# Altium footprint library Power_Lib_Altium.PcbLib: 383 footprints (part 2 of 24)
Each footprint in its own frame and in the unit in brackets; x right, y up, seen from the top. Pads: shape width x height; smd on the part's side, far side on the other; paste and mask are expansions set on the pad; w line width, h text height; cw(c..) or ccw(c..) is an arc to the next point about the centre after c.
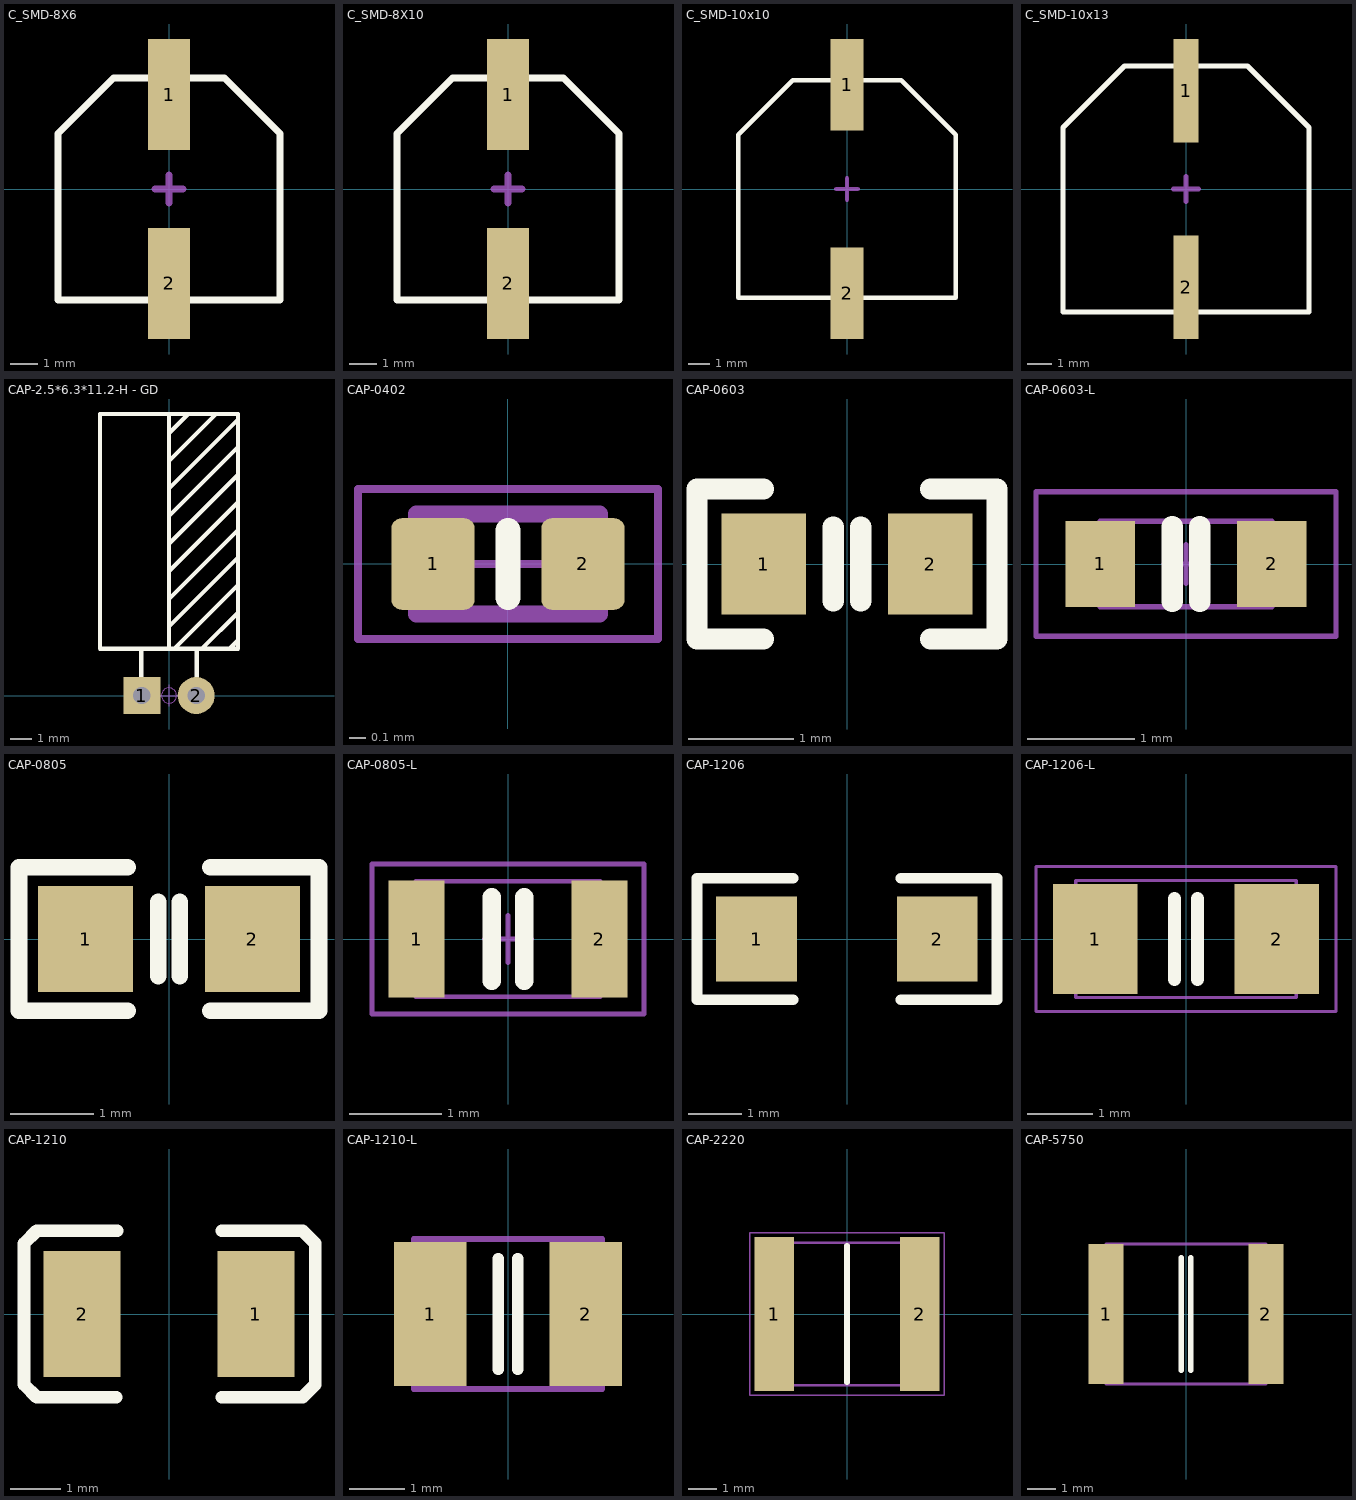
[diagram p1: the footprints below, top view; thin cyan lines are the x and y axes]

## C_SMD-8X6 [mm]
pads (2):
  rect 1.5x4 smd: 1(0,3.4) 2(0,-3.4)
Top Overlay:
  lines w0.254: -4,-4 -4,2 -2,4 2,4 4,2 4,-4 -4,-4
Mechanical 15:
  lines w0.254: -0.5,0 0.5,0 ; 0,-0.5 0,0.5
3D body "User Library-CL_series_size8x6,2.STEP": height 6.2, standoff 0, extent -4.15,-4.45 4.15,4.45

## C_SMD-8X10 [mm]
pads (2):
  rect 1.5x4 smd: 1(0,3.4) 2(0,-3.4)
Top Overlay:
  lines w0.254: -4,-4 -4,2 -2,4 2,4 4,2 4,-4 -4,-4
Mechanical 15:
  lines w0.254: -0.5,0 0.5,0 ; 0,-0.5 0,0.5
3D body "User Library-CL_series_size8x10.STEP": height 10, standoff 0, extent -4.15,-4.5 4.15,4.4

## C_SMD-10x10 [mm]
pads (2):
  rect 1.5x4.2 smd: 1(0,4.8) 2(0,-4.8)
Top Overlay:
  lines w0.2: -5,-5 5,-5 5,2.5 2.5,5 -2.5,5 -5,2.5 -5,-5
Mechanical 15:
  lines w0.2: -0.5,0 0.5,0 ; 0,-0.5 0,0.5
3D body "User Library-cap_10x10x10-1.STEP": height -0.4, standoff -10.9, extent -5.25,-5.899 5.25,5.901

## C_SMD-10x13 [mm]
pads (2):
  rect 1x4.2 smd: 1(0,4) 2(0,-4)
Top Overlay:
  lines w0.2: -5,-5 5,-5 5,2.5 2.5,5 -2.5,5 -5,2.5 -5,-5
Mechanical 15:
  lines w0.2: -0.5,0 0.5,0 ; 0,-0.5 0,0.5
3D body "6.3V 820uF.stp": height 12.3, standoff -0.4, extent -5.15,-5.15 5.15,5.15

## CAP-2.5*6.3*11.2-H - GD [mm] "脚距2.5mm直径6.3mm高度11.2mm"
pads (2):
  rect 1.7x1.7 hole 0.8: 1(-1.25,0)
  round 1.7 hole 0.8: 2(1.25,0)
Top Overlay:
  lines w0.2: -1.27,0.635 -1.27,2.032 ; 0,2.159 0,12.954 ; 0,3.175 3.175,6.35 ; 0,4.445 3.175,7.62 ; 0,5.715 3.175,8.89 ; 0,6.985 3.175,10.16 ; 0,8.255 3.175,11.43 ; 0,9.525 3.175,12.7 ; 0,10.795 2.159,12.954 ; 0,12.065 0.889,12.954 ; 0.254,2.159 3.175,5.08 3.175,4.953 ; 1.27,0.635 1.27,2.159 ; 1.524,2.159 3.175,3.81 ; 2.794,2.159 3.175,2.54 ; -3.175,2.159 3.175,2.159 3.175,12.954 -3.175,12.954 -3.175,2.159
Mechanical 15:
  circle w0.05: c0,0 r0.35
  lines w0.05: -0.5,0 0.5,0 ; 0,-0.5 0,0.5
3D body "CAP 2.5X6.3X11.2-H.STEP": height 6.32, standoff -3.48, extent -3.15,-0.3 3.16,13.11

## CAP-0402 [mm]
pads (2):
  rrect25% 0.5x0.55 smd: 1(-0.45,0) 2(0.45,0)
Top Overlay:
  lines w0.15: 0,-0.2 0,0.2
Top Courtyard:
  lines w0.05: -0.275,0 0.275,0 ; 0,-0.275 0,0.275 ; -0.9,-0.45 0.9,-0.45 0.9,0.45 -0.9,0.45 -0.9,-0.45
Top Assembly:
  lines w0.1: -0.55,-0.3 -0.55,0.3 0.55,0.3 0.55,-0.3 -0.55,-0.3
3D body "CAPC1005X60N EIA 0402.STEP": height 0.6, standoff 0, extent -0.5,-0.25 0.5,0.25

## CAP-0603 [mm]
pads (2):
  rect 0.8x0.96 smd: 1(-0.79,0) 2(0.79,0)
Top Overlay:
  lines w0.2: -0.79,-0.711 -1.422,-0.711 -1.422,0.711 -0.79,0.711 ; -0.13,-0.35 -0.13,0.35 ; 0.13,-0.35 0.13,0.35 ; 0.79,-0.711 1.422,-0.711 1.422,0.711 0.79,0.711
3D body "C_0603.STEP": height 0.9, standoff -0.01, extent -0.762,-0.391 0.762,0.391

## CAP-0603-L [mm]
pads (2):
  rect 0.65x0.8 smd: 1(-0.8,0) 2(0.8,0)
Top Overlay:
  lines w0.2: -0.13,-0.35 -0.13,0.35 ; 0.13,-0.35 0.13,0.35
Mechanical 13:
  lines w0.051: -0.203,0 0.203,0 ; 0,-0.178 0,0.178 ; -0.8,-0.4 0.8,-0.4 0.8,0.4 -0.8,0.4 -0.8,-0.4
Mechanical 14:
  lines w0.051: -1.4,-0.675 1.4,-0.675 1.4,0.675 -1.4,0.675 -1.4,-0.675
3D body "CAPC1608X08L.step": height 0.8, standoff 0, extent -0.8,-0.4 0.8,0.4

## CAP-0805 [mm]
pads (2):
  rect 1.14x1.27 smd: 1(-1.003,0) 2(1.003,0)
Top Overlay:
  lines w0.2: -0.495,-0.864 -1.803,-0.864 -1.803,0.864 -0.495,0.864 ; -0.13,-0.45 -0.13,0.45 ; 0.13,-0.45 0.13,0.45 ; 0.495,-0.864 1.803,-0.864 1.803,0.864 0.495,0.864
3D body "C_0805.STEP": height 1.01, standoff -0.01, extent -1.016,-0.645 1.016,0.645

## CAP-0805-L [mil]
height 47.24
pads (2):
  rect 24x50 smd: 1(-39,0) 2(39,0)
Top Overlay:
  lines w7.87: -6.89,-17.72 -6.89,17.72 ; 6.89,-17.72 6.89,17.72
Mechanical 13:
  lines w2: -10,0 10,0 ; 0,-10 0,10 ; -39.37,-24.61 39.37,-24.61 39.37,24.61 -39.37,24.61 -39.37,-24.61
Mechanical 14:
  lines w2: -58,-32 58,-32 58,32 -58,32 -58,-32
3D body "CAPC2012X10L.step": height 39.37, standoff 0, extent -39.37,-24.6 39.37,24.61

## CAP-1206 [mm] "贴片元件"
height 1.5
pads (2):
  rect 1.524x1.6 smd: 1(-1.703,0) 2(1.7,0)
Top Overlay:
  lines w0.2: -1.016,-1.143 -2.825,-1.143 -2.825,1.143 -2.373,1.143 -1.468,1.143 -1.016,1.143 ; 1.016,-1.143 2.825,-1.143 2.825,1.143 1.016,1.143
3D body: height 1, standoff 0, extent -1.905,-0.889 -1.397,0.889
3D body: height 1, standoff 0, extent 1.397,-0.889 1.905,0.889
3D body: height 1, standoff 0, extent -1.397,-0.889 1.397,0.889

## CAP-1206-L [mm] "Chip Capacitor, 2-Leads, Body 3.20x1.60mm, IPC Medium Density"
height 1.23
pads (2):
  rect 1.3x1.7 smd: 1(-1.4,0) 2(1.4,0)
Top Overlay:
  lines w0.2: -0.175,-0.625 -0.175,0.625 ; 0.175,-0.625 0.175,0.625
Mechanical 13:
  lines w0.051: -1.7,-0.9 1.7,-0.9 1.7,0.9 -1.7,0.9 -1.7,-0.9
Mechanical 14:
  lines w0.051: -2.311,-1.118 2.311,-1.118 2.311,1.118 -2.311,1.118 -2.311,-1.118
3D body "1206-CAP.step": height 0.5, standoff 0, extent -1.7,-0.9 1.7,0.9

## CAP-1210 [mm] "贴片电容"
height 3
pads (2):
  rect 1.52x2.5 smd: 1(1.725,0) 2(-1.725,0)
Top Overlay:
  lines w0.254: -1.05,-1.651 -2.621,-1.651 -2.875,-1.397 -2.875,1.397 -2.621,1.651 -1.025,1.651 ; 1.05,-1.651 2.646,-1.651 2.9,-1.397 2.9,1.397 2.646,1.651 1.05,1.651
3D body: height 1, standoff 0, extent -1.676,-1.27 1.626,1.27

## CAP-1210-L [mm] "Chip Capacitor, 2-Leads, Body 3.20x2.50mm, IPC Medium Density"
height 1.5
pads (2):
  rect 1.3x2.6 smd: 1(-1.4,0) 2(1.4,0)
Top Overlay:
  lines w0.2: -0.175,-1 -0.175,1 ; 0.175,-1 0.175,1
Mechanical 13:
  lines w0.1: -1.7,-1.35 1.7,-1.35 1.7,1.35 -1.7,1.35 -1.7,-1.35
3D body "1210-CAP.step": height 1.5, standoff 0, extent -1.7,-1.35 1.7,1.35

## CAP-2220 [mm]
pads (2):
  rect 1.39x5.41 smd: 1(-2.56,0) 2(2.56,0)
Top Overlay:
  lines w0.2: 0,-2.4 0,2.4
Mechanical 13:
  lines w0.1: -2.85,-2.5 2.85,-2.5 2.85,2.5 -2.85,2.5 -2.85,-2.5
Mechanical 15:
  lines w0.05: -3.405,-2.86 3.405,-2.86 3.405,2.86 -3.405,2.86 -3.405,-2.86
3D body "22201C106MAT2A.stp": height 2.54, standoff 0, extent -2.85,-2.5 2.85,2.5

## CAP-5750 [mm]
pads (2):
  rect 1.25x5 smd mask+0: 1(-2.85,0) 2(2.85,0)
Top Overlay:
  lines w0.2: -0.175,-2 -0.175,2 ; 0.175,-2 0.175,2
Mechanical 14:
  lines w0.1: -2.85,-2.5 -2.85,2.5 2.85,2.5 2.85,-2.5 -2.85,-2.5
3D body "CAP-2220.stp": height 2.74, standoff 0.04, extent -3.076,-2.718 3.024,2.682